# Altium integrated library WE_WR-TBL_Spring Clamp System_3.50 mm_rev15b.IntLib: 46 symbols
Pins are listed as number, name and electrical type; pins without a type are passive.

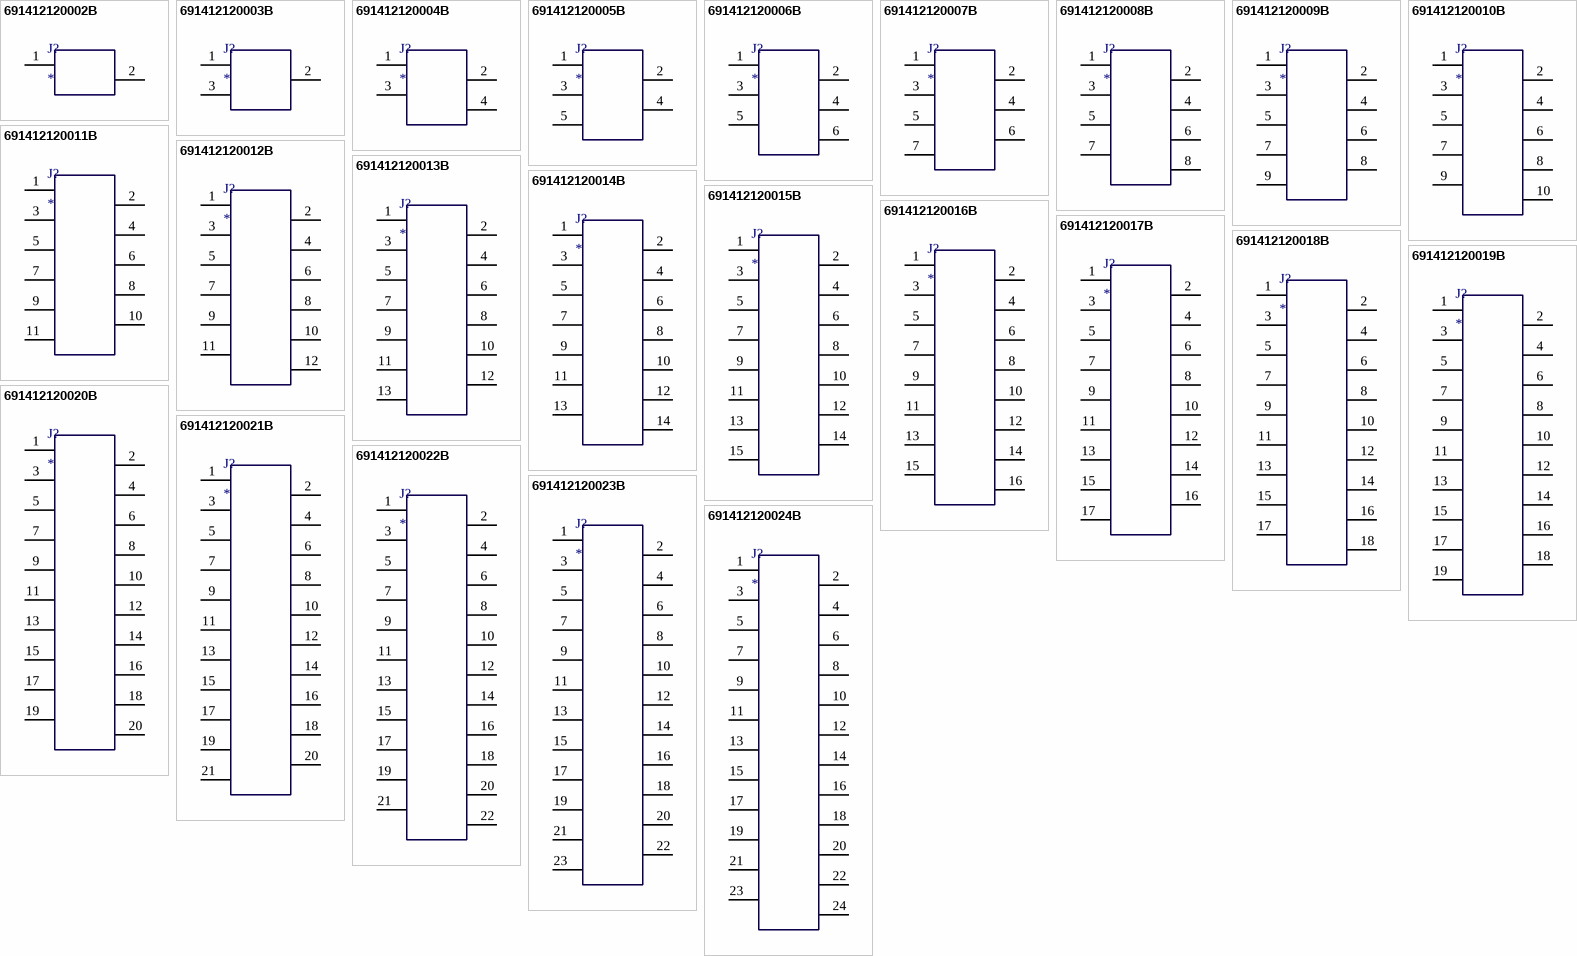
[diagram p0: symbols 691412120002B to 691412120024B]

## 691412120002B
designator J?
WR-TBL Screwless Entry 45° Grey,Serie 412 B - 3.50 mm; Manufacturer: Würth Elektronik eiSos GmbH; partNo: 691412120002B; ComponentLink1 Description: Manufacturer; ComponentLink2 Description: Datasheet; NoPins: 2; ComponentLink1URL: http://www.we-online.de; ComponentLink2URL: http://katalog.we-online.de/em/datasheet/6914121200xxB.pdf; Created by: Karrer Zheng; Created Date: 10/10/2014
footprint 691412120002B
pins: 1, 2

## 691412120003B
designator J?
WR-TBL Screwless Entry 45° Grey,Serie 412 B - 3.50 mm; Manufacturer: Würth Elektronik eiSos GmbH; partNo: 691412120003B; ComponentLink1 Description: Manufacturer; ComponentLink2 Description: Datasheet; NoPins: 3; ComponentLink1URL: http://www.we-online.de; ComponentLink2URL: http://katalog.we-online.de/em/datasheet/6914121200xxB.pdf; Created by: Karrer Zheng; Created Date: 10/10/2014
footprint 691412120003B
pins: 1, 2, 3

## 691412120004B
designator J?
WR-TBL Screwless Entry 45° Grey,Serie 412 B - 3.50 mm; Manufacturer: Würth Elektronik eiSos GmbH; partNo: 691412120004B; ComponentLink1 Description: Manufacturer; ComponentLink2 Description: Datasheet; NoPins: 4; ComponentLink1URL: http://www.we-online.de; ComponentLink2URL: http://katalog.we-online.de/em/datasheet/6914121200xxB.pdf; Created by: Karrer Zheng; Created Date: 10/10/2014
footprint 691412120004B
pins: 1, 2, 3, 4

## 691412120005B
designator J?
WR-TBL Screwless Entry 45° Grey,Serie 412 B - 3.50 mm; Manufacturer: Würth Elektronik eiSos GmbH; partNo: 691412120005B; ComponentLink1 Description: Manufacturer; ComponentLink2 Description: Datasheet; NoPins: 5; ComponentLink1URL: http://www.we-online.de; ComponentLink2URL: http://katalog.we-online.de/em/datasheet/6914121200xxB.pdf; Created by: Karrer Zheng; Created Date: 10/10/2014
footprint 691412120005B
pins: 1, 2, 3, 4, 5

## 691412120006B
designator J?
WR-TBL Screwless Entry 45° Grey,Serie 412 B - 3.50 mm; Manufacturer: Würth Elektronik eiSos GmbH; partNo: 691412120006B; ComponentLink1 Description: Manufacturer; ComponentLink2 Description: Datasheet; NoPins: 6; ComponentLink1URL: http://www.we-online.de; ComponentLink2URL: http://katalog.we-online.de/em/datasheet/6914121200xxB.pdf; Created by: Karrer Zheng; Created Date: 10/10/2014
footprint 691412120006B
pins: 1, 2, 3, 4, 5, 6

## 691412120007B
designator J?
WR-TBL Screwless Entry 45° Grey,Serie 412 B - 3.50 mm; Manufacturer: Würth Elektronik eiSos GmbH; partNo: 691412120007B; ComponentLink1 Description: Manufacturer; ComponentLink2 Description: Datasheet; NoPins: 7; ComponentLink1URL: http://www.we-online.de; ComponentLink2URL: http://katalog.we-online.de/em/datasheet/6914121200xxB.pdf; Created by: Karrer Zheng; Created Date: 10/10/2014
footprint 691412120007B
pins: 1, 2, 3, 4, 5, 6, 7

## 691412120008B
designator J?
WR-TBL Screwless Entry 45° Grey,Serie 412 B - 3.50 mm; Manufacturer: Würth Elektronik eiSos GmbH; partNo: 691412120008B; ComponentLink1 Description: Manufacturer; ComponentLink2 Description: Datasheet; NoPins: 8; ComponentLink1URL: http://www.we-online.de; ComponentLink2URL: http://katalog.we-online.de/em/datasheet/6914121200xxB.pdf; Created by: Karrer Zheng; Created Date: 10/10/2014
footprint 691412120008B
pins: 1, 2, 3, 4, 5, 6, 7, 8

## 691412120009B
designator J?
WR-TBL Screwless Entry 45° Grey,Serie 412 B - 3.50 mm; Manufacturer: Würth Elektronik eiSos GmbH; partNo: 691412120009B; ComponentLink1 Description: Manufacturer; ComponentLink2 Description: Datasheet; NoPins: 9; ComponentLink1URL: http://www.we-online.de; ComponentLink2URL: http://katalog.we-online.de/em/datasheet/6914121200xxB.pdf; Created by: Karrer Zheng; Created Date: 10/10/2014
footprint 691412120009B
pins: 1, 2, 3, 4, 5, 6, 7, 8, 9

## 691412120010B
designator J?
WR-TBL Screwless Entry 45° Grey,Serie 412 B - 3.50 mm; Manufacturer: Würth Elektronik eiSos GmbH; partNo: 691412120010B; ComponentLink1 Description: Manufacturer; ComponentLink2 Description: Datasheet; NoPins: 10; ComponentLink1URL: http://www.we-online.de; ComponentLink2URL: http://katalog.we-online.de/em/datasheet/6914121200xxB.pdf; Created by: Karrer Zheng; Created Date: 10/10/2014
footprint 691412120010B
pins: 1, 2, 3, 4, 5, 6, 7, 8, 9, 10

## 691412120011B
designator J?
WR-TBL Screwless Entry 45° Grey,Serie 412 B - 3.50 mm; Manufacturer: Würth Elektronik eiSos GmbH; partNo: 691412120011B; ComponentLink1 Description: Manufacturer; ComponentLink2 Description: Datasheet; NoPins: 11; ComponentLink1URL: http://www.we-online.de; ComponentLink2URL: http://katalog.we-online.de/em/datasheet/6914121200xxB.pdf; Created by: Karrer Zheng; Created Date: 10/10/2014
footprint 691412120011B
pins: 1, 2, 3, 4, 5, 6, 7, 8, 9, 10, 11

## 691412120012B
designator J?
WR-TBL Screwless Entry 45° Grey,Serie 412 B - 3.50 mm; Manufacturer: Würth Elektronik eiSos GmbH; partNo: 691412120012B; ComponentLink1 Description: Manufacturer; ComponentLink2 Description: Datasheet; NoPins: 12; ComponentLink1URL: http://www.we-online.de; ComponentLink2URL: http://katalog.we-online.de/em/datasheet/6914121200xxB.pdf; Created by: Karrer Zheng; Created Date: 10/10/2014
footprint 691412120012B
pins: 1, 2, 3, 4, 5, 6, 7, 8, 9, 10, 11, 12

## 691412120013B
designator J?
WR-TBL Screwless Entry 45° Grey,Serie 412 B - 3.50 mm; Manufacturer: Würth Elektronik eiSos GmbH; partNo: 691412120013B; ComponentLink1 Description: Manufacturer; ComponentLink2 Description: Datasheet; NoPins: 13; ComponentLink1URL: http://www.we-online.de; ComponentLink2URL: http://katalog.we-online.de/em/datasheet/6914121200xxB.pdf; Created by: Karrer Zheng; Created Date: 10/10/2014
footprint 691412120013B
pins: 1, 2, 3, 4, 5, 6, 7, 8, 9, 10, 11, 12, 13

## 691412120014B
designator J?
WR-TBL Screwless Entry 45° Grey,Serie 412 B - 3.50 mm; Manufacturer: Würth Elektronik eiSos GmbH; partNo: 691412120014B; ComponentLink1 Description: Manufacturer; ComponentLink2 Description: Datasheet; NoPins: 14; ComponentLink1URL: http://www.we-online.de; ComponentLink2URL: http://katalog.we-online.de/em/datasheet/6914121200xxB.pdf; Created by: Karrer Zheng; Created Date: 10/10/2014
footprint 691412120014B
pins: 1, 2, 3, 4, 5, 6, 7, 8, 9, 10, 11, 12, 13, 14

## 691412120015B
designator J?
WR-TBL Screwless Entry 45° Grey,Serie 412 B - 3.50 mm; Manufacturer: Würth Elektronik eiSos GmbH; partNo: 691412120015B; ComponentLink1 Description: Manufacturer; ComponentLink2 Description: Datasheet; NoPins: 15; ComponentLink1URL: http://www.we-online.de; ComponentLink2URL: http://katalog.we-online.de/em/datasheet/6914121200xxB.pdf; Created by: Karrer Zheng; Created Date: 10/10/2014
footprint 691412120015B
pins: 1, 2, 3, 4, 5, 6, 7, 8, 9, 10, 11, 12, 13, 14, 15

## 691412120016B
designator J?
WR-TBL Screwless Entry 45° Grey,Serie 412 B - 3.50 mm; Manufacturer: Würth Elektronik eiSos GmbH; partNo: 691412120016B; ComponentLink1 Description: Manufacturer; ComponentLink2 Description: Datasheet; NoPins: 16; ComponentLink1URL: http://www.we-online.de; ComponentLink2URL: http://katalog.we-online.de/em/datasheet/6914121200xxB.pdf; Created by: Karrer Zheng; Created Date: 10/10/2014
footprint 691412120016B
pins: 1, 2, 3, 4, 5, 6, 7, 8, 9, 10, 11, 12, 13, 14, 15, 16

## 691412120017B
designator J?
WR-TBL Screwless Entry 45° Grey,Serie 412 B - 3.50 mm; Manufacturer: Würth Elektronik eiSos GmbH; partNo: 691412120017B; ComponentLink1 Description: Manufacturer; ComponentLink2 Description: Datasheet; NoPins: 17; ComponentLink1URL: http://www.we-online.de; ComponentLink2URL: http://katalog.we-online.de/em/datasheet/6914121200xxB.pdf; Created by: Karrer Zheng; Created Date: 10/10/2014
footprint 691412120017B
pins: 1, 2, 3, 4, 5, 6, 7, 8, 9, 10, 11, 12, 13, 14, 15, 16, 17

## 691412120018B
designator J?
WR-TBL Screwless Entry 45° Grey,Serie 412 B - 3.50 mm; Manufacturer: Würth Elektronik eiSos GmbH; partNo: 691412120018B; ComponentLink1 Description: Manufacturer; ComponentLink2 Description: Datasheet; NoPins: 18; ComponentLink1URL: http://www.we-online.de; ComponentLink2URL: http://katalog.we-online.de/em/datasheet/6914121200xxB.pdf; Created by: Karrer Zheng; Created Date: 10/10/2014
footprint 691412120018B
pins: 1, 2, 3, 4, 5, 6, 7, 8, 9, 10, 11, 12, 13, 14, 15, 16, 17, 18

## 691412120019B
designator J?
WR-TBL Screwless Entry 45° Grey,Serie 412 B - 3.50 mm; Manufacturer: Würth Elektronik eiSos GmbH; partNo: 691412120019B; ComponentLink1 Description: Manufacturer; ComponentLink2 Description: Datasheet; NoPins: 19; ComponentLink1URL: http://www.we-online.de; ComponentLink2URL: http://katalog.we-online.de/em/datasheet/6914121200xxB.pdf; Created by: Karrer Zheng; Created Date: 10/10/2014
footprint 691412120019B
pins: 1, 2, 3, 4, 5, 6, 7, 8, 9, 10, 11, 12, 13, 14, 15, 16, 17, 18, 19

## 691412120020B
designator J?
WR-TBL Screwless Entry 45° Grey,Serie 412 B - 3.50 mm; Manufacturer: Würth Elektronik eiSos GmbH; partNo: 691412120020B; ComponentLink1 Description: Manufacturer; ComponentLink2 Description: Datasheet; NoPins: 20; ComponentLink1URL: http://www.we-online.de; ComponentLink2URL: http://katalog.we-online.de/em/datasheet/6914121200xxB.pdf; Created by: Karrer Zheng; Created Date: 10/10/2014
footprint 691412120020B
pins: 1, 2, 3, 4, 5, 6, 7, 8, 9, 10, 11, 12, 13, 14, 15, 16, 17, 18, 19, 20

## 691412120021B
designator J?
WR-TBL Screwless Entry 45° Grey,Serie 412 B - 3.50 mm; Manufacturer: Würth Elektronik eiSos GmbH; partNo: 691412120021B; ComponentLink1 Description: Manufacturer; ComponentLink2 Description: Datasheet; NoPins: 21; ComponentLink1URL: http://www.we-online.de; ComponentLink2URL: http://katalog.we-online.de/em/datasheet/6914121200xxB.pdf; Created by: Karrer Zheng; Created Date: 10/10/2014
footprint 691412120021B
pins: 1, 2, 3, 4, 5, 6, 7, 8, 9, 10, 11, 12, 13, 14, 15, 16, 17, 18, 19, 20, 21

## 691412120022B
designator J?
WR-TBL Screwless Entry 45° Grey,Serie 412 B - 3.50 mm; Manufacturer: Würth Elektronik eiSos GmbH; partNo: 691412120022B; ComponentLink1 Description: Manufacturer; ComponentLink2 Description: Datasheet; NoPins: 22; ComponentLink1URL: http://www.we-online.de; ComponentLink2URL: http://katalog.we-online.de/em/datasheet/6914121200xxB.pdf; Created by: Karrer Zheng; Created Date: 10/10/2014
footprint 691412120022B
pins: 1, 2, 3, 4, 5, 6, 7, 8, 9, 10, 11, 12, 13, 14, 15, 16, 17, 18, 19, 20, 21, 22

## 691412120023B
designator J?
WR-TBL Screwless Entry 45° Grey,Serie 412 B - 3.50 mm; Manufacturer: Würth Elektronik eiSos GmbH; partNo: 691412120023B; ComponentLink1 Description: Manufacturer; ComponentLink2 Description: Datasheet; NoPins: 23; ComponentLink1URL: http://www.we-online.de; ComponentLink2URL: http://katalog.we-online.de/em/datasheet/6914121200xxB.pdf; Created by: Karrer Zheng; Created Date: 10/10/2014
footprint 691412120023B
pins: 1, 2, 3, 4, 5, 6, 7, 8, 9, 10, 11, 12, 13, 14, 15, 16, 17, 18, 19, 20, 21, 22, 23

## 691412120024B
designator J?
WR-TBL Screwless Entry 45° Grey,Serie 412 B - 3.50 mm; Manufacturer: Würth Elektronik eiSos GmbH; partNo: 691412120024B; ComponentLink1 Description: Manufacturer; ComponentLink2 Description: Datasheet; NoPins: 24; ComponentLink1URL: http://www.we-online.de; ComponentLink2URL: http://katalog.we-online.de/em/datasheet/6914121200xxB.pdf; Created by: Karrer Zheng; Created Date: 10/10/2014
footprint 691412120024B
pins: 1, 2, 3, 4, 5, 6, 7, 8, 9, 10, 11, 12, 13, 14, 15, 16, 17, 18, 19, 20, 21, 22, 23, 24


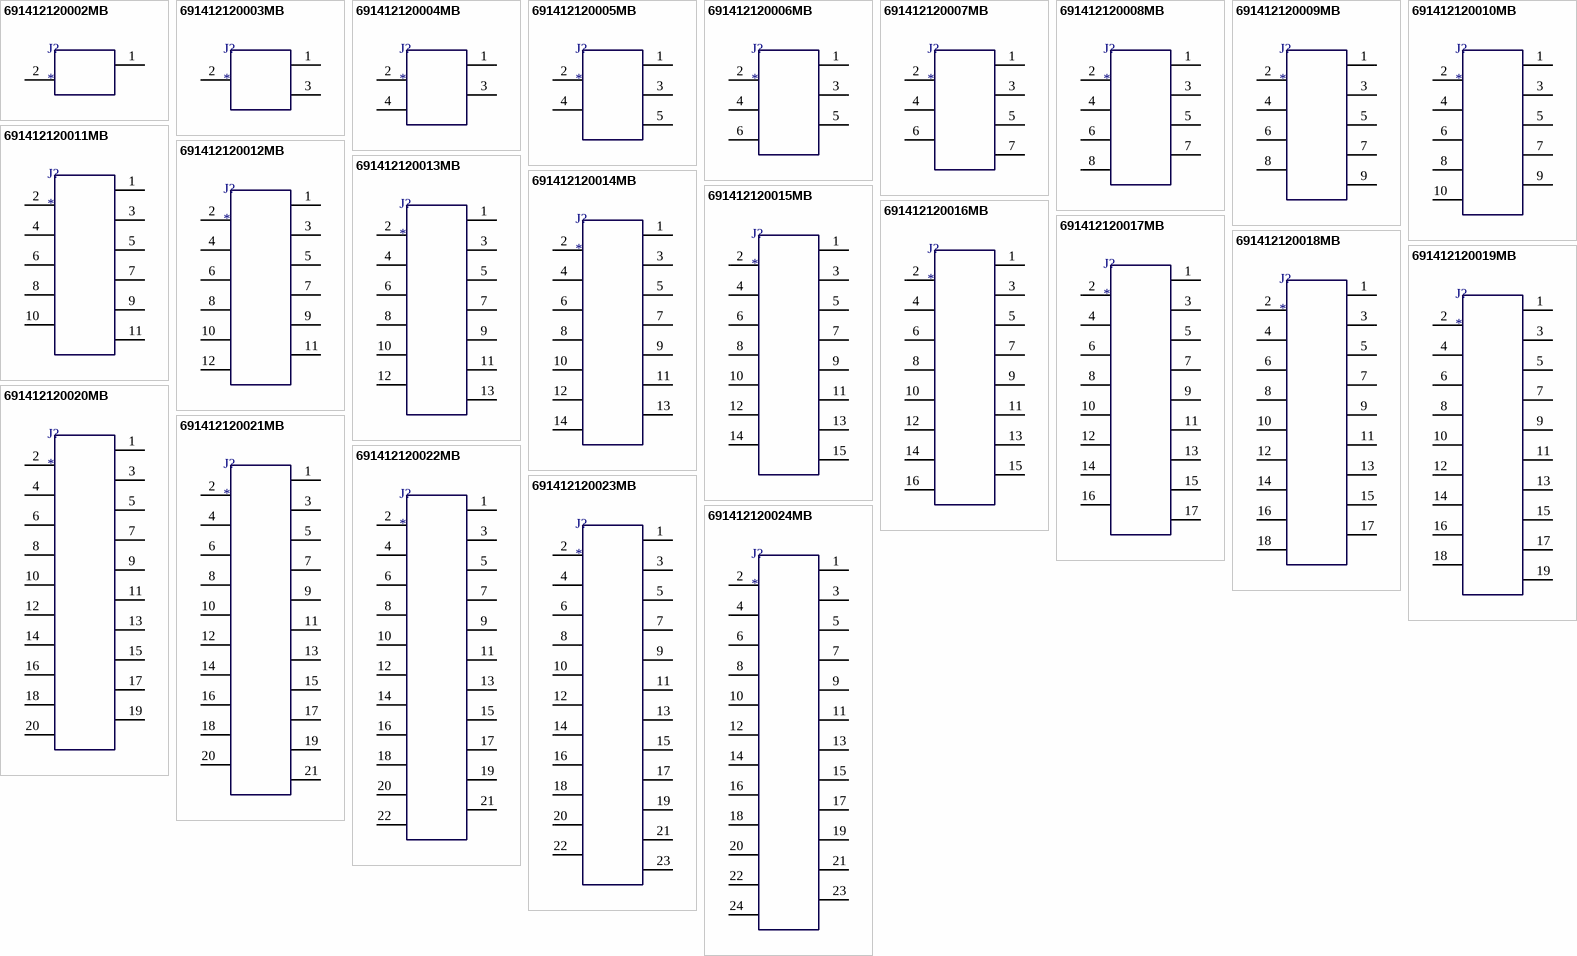
[diagram p1: symbols 691412120002MB to 691412120024MB]

## 691412120002MB
designator J?
WR-TBL Screwless Entry 45° Grey,Serie 412 MB - 3.50 mm; Manufacturer: Würth Elektronik eiSos GmbH; partNo: 691412120002MB; ComponentLink1 Description: Manufacturer; ComponentLink2 Description: Datasheet; NoPins: 2; ComponentLink1URL: http://www.we-online.de; ComponentLink2URL: http://katalog.we-online.de/em/datasheet/6914121200xxMB.pdf; Created by: Karrer Zheng; Created Date: 10/10/2014
footprint 691412120002MB
pins: 1, 2

## 691412120003MB
designator J?
WR-TBL Screwless Entry 45° Grey,Serie 412 MB - 3.50 mm; Manufacturer: Würth Elektronik eiSos GmbH; partNo: 691412120003MB; ComponentLink1 Description: Manufacturer; ComponentLink2 Description: Datasheet; NoPins: 3; ComponentLink1URL: http://www.we-online.de; ComponentLink2URL: http://katalog.we-online.de/em/datasheet/6914121200xxMB.pdf; Created by: Karrer Zheng; Created Date: 10/10/2014
footprint 691412120003MB
pins: 1, 2, 3

## 691412120004MB
designator J?
WR-TBL Screwless Entry 45° Grey,Serie 412 MB - 3.50 mm; Manufacturer: Würth Elektronik eiSos GmbH; partNo: 691412120004MB; ComponentLink1 Description: Manufacturer; ComponentLink2 Description: Datasheet; NoPins: 4; ComponentLink1URL: http://www.we-online.de; ComponentLink2URL: http://katalog.we-online.de/em/datasheet/6914121200xxMB.pdf; Created by: Karrer Zheng; Created Date: 10/10/2014
footprint 691412120004MB
pins: 1, 2, 3, 4

## 691412120005MB
designator J?
WR-TBL Screwless Entry 45° Grey,Serie 412 MB - 3.50 mm; Manufacturer: Würth Elektronik eiSos GmbH; partNo: 691412120005MB; ComponentLink1 Description: Manufacturer; ComponentLink2 Description: Datasheet; NoPins: 5; ComponentLink1URL: http://www.we-online.de; ComponentLink2URL: http://katalog.we-online.de/em/datasheet/6914121200xxMB.pdf; Created by: Karrer Zheng; Created Date: 10/10/2014
footprint 691412120005MB
pins: 1, 2, 3, 4, 5

## 691412120006MB
designator J?
WR-TBL Screwless Entry 45° Grey,Serie 412 MB - 3.50 mm; Manufacturer: Würth Elektronik eiSos GmbH; partNo: 691412120006MB; ComponentLink1 Description: Manufacturer; ComponentLink2 Description: Datasheet; NoPins: 6; ComponentLink1URL: http://www.we-online.de; ComponentLink2URL: http://katalog.we-online.de/em/datasheet/6914121200xxMB.pdf; Created by: Karrer Zheng; Created Date: 10/10/2014
footprint 691412120006MB
pins: 1, 2, 3, 4, 5, 6

## 691412120007MB
designator J?
WR-TBL Screwless Entry 45° Grey,Serie 412 MB - 3.50 mm; Manufacturer: Würth Elektronik eiSos GmbH; partNo: 691412120007MB; ComponentLink1 Description: Manufacturer; ComponentLink2 Description: Datasheet; NoPins: 7; ComponentLink1URL: http://www.we-online.de; ComponentLink2URL: http://katalog.we-online.de/em/datasheet/6914121200xxMB.pdf; Created by: Karrer Zheng; Created Date: 10/10/2014
footprint 691412120007MB
pins: 1, 2, 3, 4, 5, 6, 7

## 691412120008MB
designator J?
WR-TBL Screwless Entry 45° Grey,Serie 412 MB - 3.50 mm; Manufacturer: Würth Elektronik eiSos GmbH; partNo: 691412120008MB; ComponentLink1 Description: Manufacturer; ComponentLink2 Description: Datasheet; NoPins: 8; ComponentLink1URL: http://www.we-online.de; ComponentLink2URL: http://katalog.we-online.de/em/datasheet/6914121200xxMB.pdf; Created by: Karrer Zheng; Created Date: 10/10/2014
footprint 691412120008MB
pins: 1, 2, 3, 4, 5, 6, 7, 8

## 691412120009MB
designator J?
WR-TBL Screwless Entry 45° Grey,Serie 412 MB - 3.50 mm; Manufacturer: Würth Elektronik eiSos GmbH; partNo: 691412120009MB; ComponentLink1 Description: Manufacturer; ComponentLink2 Description: Datasheet; NoPins: 9; ComponentLink1URL: http://www.we-online.de; ComponentLink2URL: http://katalog.we-online.de/em/datasheet/6914121200xxMB.pdf; Created by: Karrer Zheng; Created Date: 10/10/2014
footprint 691412120009MB
pins: 1, 2, 3, 4, 5, 6, 7, 8, 9

## 691412120010MB
designator J?
WR-TBL Screwless Entry 45° Grey,Serie 412 MB - 3.50 mm; Manufacturer: Würth Elektronik eiSos GmbH; partNo: 691412120010MB; ComponentLink1 Description: Manufacturer; ComponentLink2 Description: Datasheet; NoPins: 10; ComponentLink1URL: http://www.we-online.de; ComponentLink2URL: http://katalog.we-online.de/em/datasheet/6914121200xxMB.pdf; Created by: Karrer Zheng; Created Date: 10/10/2014
footprint 691412120010MB
pins: 1, 2, 3, 4, 5, 6, 7, 8, 9, 10

## 691412120011MB
designator J?
WR-TBL Screwless Entry 45° Grey,Serie 412 MB - 3.50 mm; Manufacturer: Würth Elektronik eiSos GmbH; partNo: 691412120011MB; ComponentLink1 Description: Manufacturer; ComponentLink2 Description: Datasheet; NoPins: 11; ComponentLink1URL: http://www.we-online.de; ComponentLink2URL: http://katalog.we-online.de/em/datasheet/6914121200xxMB.pdf; Created by: Karrer Zheng; Created Date: 10/10/2014
footprint 691412120011MB
pins: 1, 2, 3, 4, 5, 6, 7, 8, 9, 10, 11

## 691412120012MB
designator J?
WR-TBL Screwless Entry 45° Grey,Serie 412 MB - 3.50 mm; Manufacturer: Würth Elektronik eiSos GmbH; partNo: 691412120012MB; ComponentLink1 Description: Manufacturer; ComponentLink2 Description: Datasheet; NoPins: 12; ComponentLink1URL: http://www.we-online.de; ComponentLink2URL: http://katalog.we-online.de/em/datasheet/6914121200xxMB.pdf; Created by: Karrer Zheng; Created Date: 10/10/2014
footprint 691412120012MB
pins: 1, 2, 3, 4, 5, 6, 7, 8, 9, 10, 11, 12

## 691412120013MB
designator J?
WR-TBL Screwless Entry 45° Grey,Serie 412 MB - 3.50 mm; Manufacturer: Würth Elektronik eiSos GmbH; partNo: 691412120013MB; ComponentLink1 Description: Manufacturer; ComponentLink2 Description: Datasheet; NoPins: 13; ComponentLink1URL: http://www.we-online.de; ComponentLink2URL: http://katalog.we-online.de/em/datasheet/6914121200xxMB.pdf; Created by: Karrer Zheng; Created Date: 10/10/2014
footprint 691412120013MB
pins: 1, 2, 3, 4, 5, 6, 7, 8, 9, 10, 11, 12, 13

## 691412120014MB
designator J?
WR-TBL Screwless Entry 45° Grey,Serie 412 MB - 3.50 mm; Manufacturer: Würth Elektronik eiSos GmbH; partNo: 691412120014MB; ComponentLink1 Description: Manufacturer; ComponentLink2 Description: Datasheet; NoPins: 14; ComponentLink1URL: http://www.we-online.de; ComponentLink2URL: http://katalog.we-online.de/em/datasheet/6914121200xxMB.pdf; Created by: Karrer Zheng; Created Date: 10/10/2014
footprint 691412120014MB
pins: 1, 2, 3, 4, 5, 6, 7, 8, 9, 10, 11, 12, 13, 14

## 691412120015MB
designator J?
WR-TBL Screwless Entry 45° Grey,Serie 412 MB - 3.50 mm; Manufacturer: Würth Elektronik eiSos GmbH; partNo: 691412120015MB; ComponentLink1 Description: Manufacturer; ComponentLink2 Description: Datasheet; NoPins: 15; ComponentLink1URL: http://www.we-online.de; ComponentLink2URL: http://katalog.we-online.de/em/datasheet/6914121200xxMB.pdf; Created by: Karrer Zheng; Created Date: 10/10/2014
footprint 691412120015MB
pins: 1, 2, 3, 4, 5, 6, 7, 8, 9, 10, 11, 12, 13, 14, 15

## 691412120016MB
designator J?
WR-TBL Screwless Entry 45° Grey,Serie 412 MB - 3.50 mm; Manufacturer: Würth Elektronik eiSos GmbH; partNo: 691412120016MB; ComponentLink1 Description: Manufacturer; ComponentLink2 Description: Datasheet; NoPins: 16; ComponentLink1URL: http://www.we-online.de; ComponentLink2URL: http://katalog.we-online.de/em/datasheet/6914121200xxMB.pdf; Created by: Karrer Zheng; Created Date: 10/10/2014
footprint 691412120016MB
pins: 1, 2, 3, 4, 5, 6, 7, 8, 9, 10, 11, 12, 13, 14, 15, 16

## 691412120017MB
designator J?
WR-TBL Screwless Entry 45° Grey,Serie 412 MB - 3.50 mm; Manufacturer: Würth Elektronik eiSos GmbH; partNo: 691412120017MB; ComponentLink1 Description: Manufacturer; ComponentLink2 Description: Datasheet; NoPins: 17; ComponentLink1URL: http://www.we-online.de; ComponentLink2URL: http://katalog.we-online.de/em/datasheet/6914121200xxMB.pdf; Created by: Karrer Zheng; Created Date: 10/10/2014
footprint 691412120017MB
pins: 1, 2, 3, 4, 5, 6, 7, 8, 9, 10, 11, 12, 13, 14, 15, 16, 17

## 691412120018MB
designator J?
WR-TBL Screwless Entry 45° Grey,Serie 412 MB - 3.50 mm; Manufacturer: Würth Elektronik eiSos GmbH; partNo: 691412120018MB; ComponentLink1 Description: Manufacturer; ComponentLink2 Description: Datasheet; NoPins: 18; ComponentLink1URL: http://www.we-online.de; ComponentLink2URL: http://katalog.we-online.de/em/datasheet/6914121200xxMB.pdf; Created by: Karrer Zheng; Created Date: 10/10/2014
footprint 691412120018MB
pins: 1, 2, 3, 4, 5, 6, 7, 8, 9, 10, 11, 12, 13, 14, 15, 16, 17, 18

## 691412120019MB
designator J?
WR-TBL Screwless Entry 45° Grey,Serie 412 MB - 3.50 mm; Manufacturer: Würth Elektronik eiSos GmbH; partNo: 691412120019MB; ComponentLink1 Description: Manufacturer; ComponentLink2 Description: Datasheet; NoPins: 19; ComponentLink1URL: http://www.we-online.de; ComponentLink2URL: http://katalog.we-online.de/em/datasheet/6914121200xxMB.pdf; Created by: Karrer Zheng; Created Date: 10/10/2014
footprint 691412120019MB
pins: 1, 2, 3, 4, 5, 6, 7, 8, 9, 10, 11, 12, 13, 14, 15, 16, 17, 18, 19

## 691412120020MB
designator J?
WR-TBL Screwless Entry 45° Grey,Serie 412 MB - 3.50 mm; Manufacturer: Würth Elektronik eiSos GmbH; partNo: 691412120020MB; ComponentLink1 Description: Manufacturer; ComponentLink2 Description: Datasheet; NoPins: 20; ComponentLink1URL: http://www.we-online.de; ComponentLink2URL: http://katalog.we-online.de/em/datasheet/6914121200xxMB.pdf; Created by: Karrer Zheng; Created Date: 10/10/2014
footprint 691412120020MB
pins: 1, 2, 3, 4, 5, 6, 7, 8, 9, 10, 11, 12, 13, 14, 15, 16, 17, 18, 19, 20

## 691412120021MB
designator J?
WR-TBL Screwless Entry 45° Grey,Serie 412 MB - 3.50 mm; Manufacturer: Würth Elektronik eiSos GmbH; partNo: 691412120021MB; ComponentLink1 Description: Manufacturer; ComponentLink2 Description: Datasheet; NoPins: 21; ComponentLink1URL: http://www.we-online.de; ComponentLink2URL: http://katalog.we-online.de/em/datasheet/6914121200xxMB.pdf; Created by: Karrer Zheng; Created Date: 10/10/2014
footprint 691412120021MB
pins: 1, 2, 3, 4, 5, 6, 7, 8, 9, 10, 11, 12, 13, 14, 15, 16, 17, 18, 19, 20, 21

## 691412120022MB
designator J?
WR-TBL Screwless Entry 45° Grey,Serie 412 MB - 3.50 mm; Manufacturer: Würth Elektronik eiSos GmbH; partNo: 691412120022MB; ComponentLink1 Description: Manufacturer; ComponentLink2 Description: Datasheet; NoPins: 22; ComponentLink1URL: http://www.we-online.de; ComponentLink2URL: http://katalog.we-online.de/em/datasheet/6914121200xxMB.pdf; Created by: Karrer Zheng; Created Date: 10/10/2014
footprint 691412120022MB
pins: 1, 2, 3, 4, 5, 6, 7, 8, 9, 10, 11, 12, 13, 14, 15, 16, 17, 18, 19, 20, 21, 22

## 691412120023MB
designator J?
WR-TBL Screwless Entry 45° Grey,Serie 412 MB - 3.50 mm; Manufacturer: Würth Elektronik eiSos GmbH; partNo: 691412120023MB; ComponentLink1 Description: Manufacturer; ComponentLink2 Description: Datasheet; NoPins: 23; ComponentLink1URL: http://www.we-online.de; ComponentLink2URL: http://katalog.we-online.de/em/datasheet/6914121200xxMB.pdf; Created by: Karrer Zheng; Created Date: 10/10/2014
footprint 691412120023MB
pins: 1, 2, 3, 4, 5, 6, 7, 8, 9, 10, 11, 12, 13, 14, 15, 16, 17, 18, 19, 20, 21, 22, 23

## 691412120024MB
designator J?
WR-TBL Screwless Entry 45° Grey,Serie 412 MB - 3.50 mm; Manufacturer: Würth Elektronik eiSos GmbH; partNo: 691412120024MB; ComponentLink1 Description: Manufacturer; ComponentLink2 Description: Datasheet; NoPins: 24; ComponentLink1URL: http://www.we-online.de; ComponentLink2URL: http://katalog.we-online.de/em/datasheet/6914121200xxMB.pdf; Created by: Karrer Zheng; Created Date: 10/10/2014
footprint 691412120024MB
pins: 1, 2, 3, 4, 5, 6, 7, 8, 9, 10, 11, 12, 13, 14, 15, 16, 17, 18, 19, 20, 21, 22, 23, 24